# Altium footprint library myPCBLib.PcbLib: 113 footprints (part 7 of 8)
Each footprint in its own frame and in the unit in brackets; x right, y up, seen from the top. Pads: shape width x height; smd on the part's side, far side on the other; paste and mask are expansions set on the pad; w line width, h text height; cw(c..) or ccw(c..) is an arc to the next point about the centre after c.
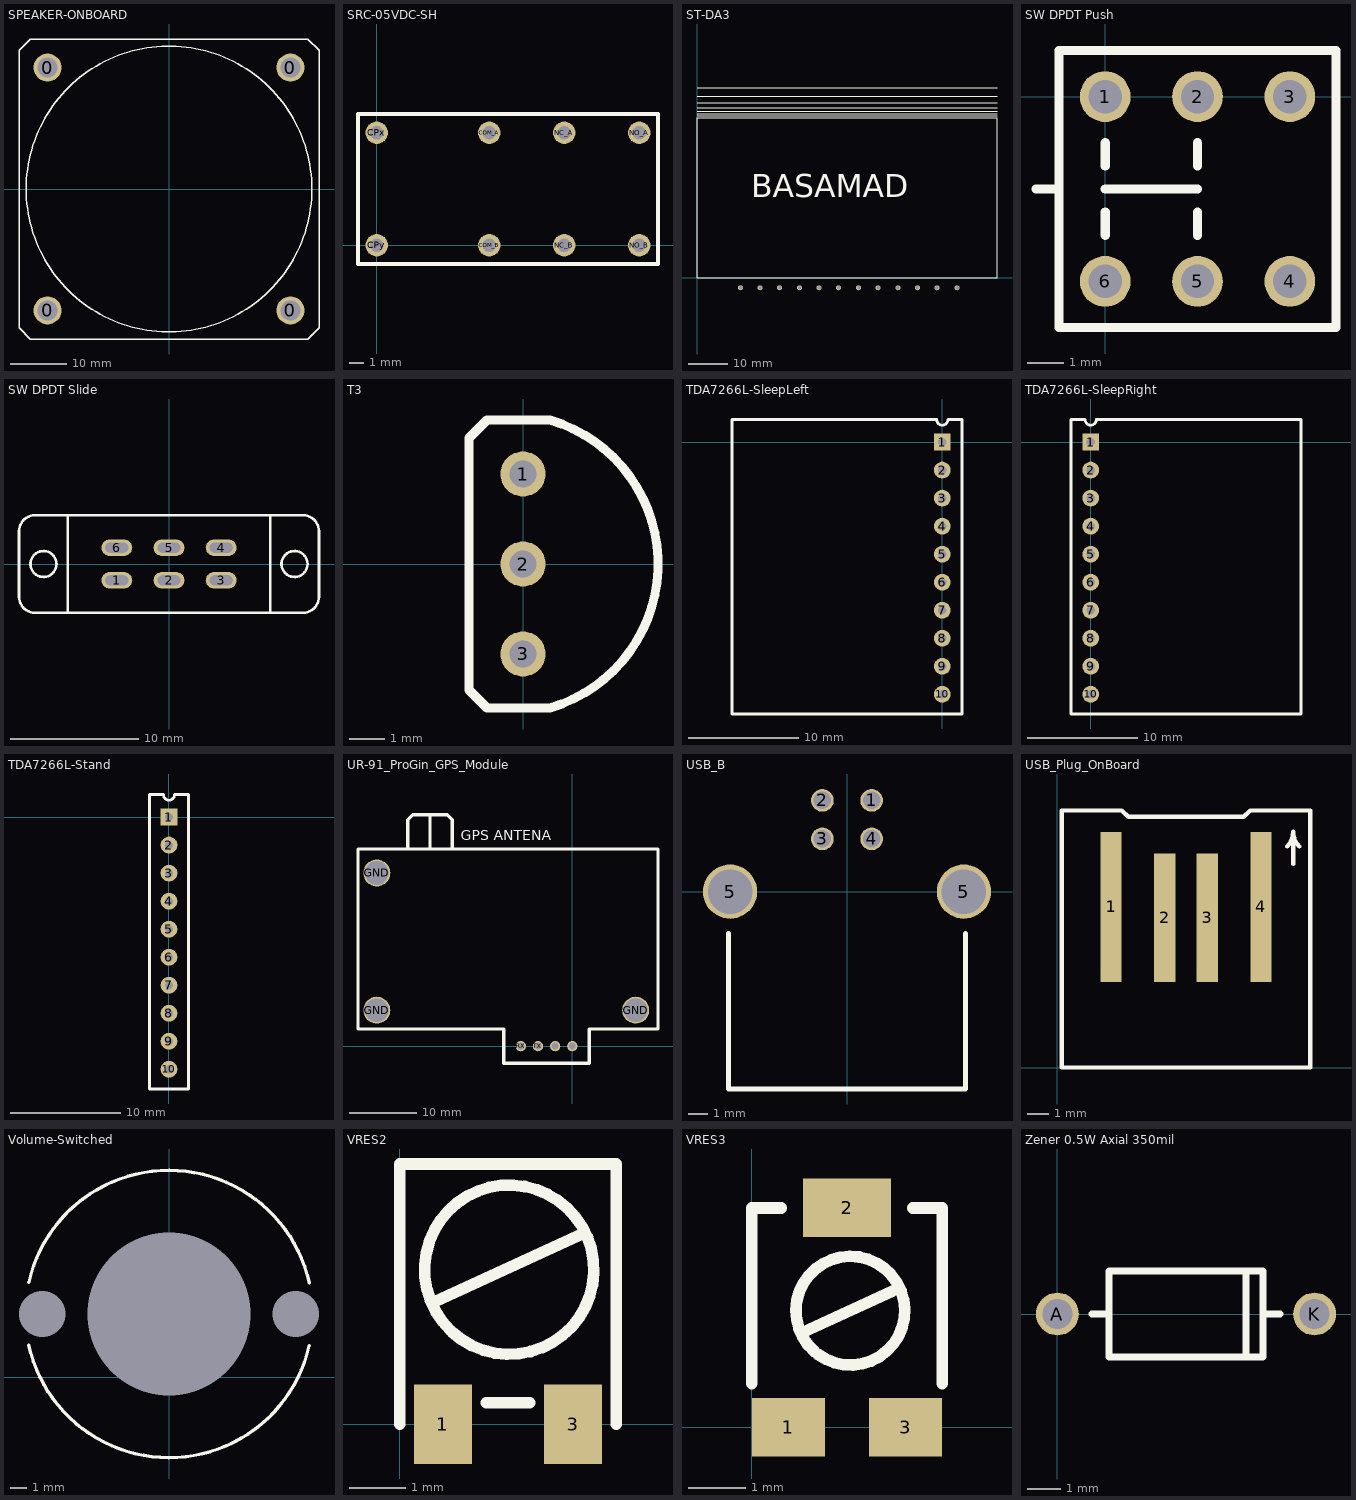
[diagram p6: the footprints below, top view; thin cyan lines are the x and y axes]

## SPEAKER-ONBOARD [mm]
pads (4):
  round 5 hole 3.5: 0(-21.59,-21.59) 0(-21.59,21.59) 0(21.59,-21.59) 0(21.59,21.59)
Top Overlay:
  circle w0.254: c0,0 r25.4
  lines w0.254: -26.67,-24.638 -26.67,24.638 -24.638,26.67 24.638,26.67 26.67,24.638 26.67,-24.638 24.638,-26.67 -24.638,-26.67 -26.67,-24.638

## SRC-05VDC-SH [mil] "Tele-Comunication Relay"
height 450
pads (8):
  round 60 hole 35.43: COM_A(300,300) COM_B(300,0) CPx(0,300) CPy(0,0) NC_A(500,300) NC_B(500,0) NO_A(700,300) NO_B(700,0)
Top Overlay:
  lines w10: -50,-50 -50,350 750,350 750,-50 -50,-50

## ST-DA3 [mil] "ST-DA3 Amplifier"
height 787.4
pads (12):
  round 50 hole 35: 1(435,-100) 2(630,-100) 3(825,-100) 4(1025,-100) 5(1220,-100) 6(1415,-100) 7(1615,-100) 8(1810,-100) 9(2010,-100) 10(2205,-100) 11(2400,-100) 12(2600,-100)
Top Overlay:
  lines w8: 0,1620 3000,1620 ; 0,1640 3000,1640 ; 0,1665 3000,1665 ; 0,1700 3000,1700 ; 0,1750 3000,1750 ; 0,1815 3000,1815 ; 0,1900 3000,1900 ; 0,0 3000,0 3000,1600 0,1600 0,0
  text "BASAMAD" at 540,730 h393.7

## SW DPDT Push [mil]
pads (6):
  round 55 hole 36: 1(0,0) 2(100,0) 3(200,0) 4(200,-200) 5(100,-200) 6(0,-200)
Top Overlay:
  lines w10: -75,-100 -50,-100 ; 0,-150 0,-125 ; 0,-100 100,-100 ; 0,-75 0,-50 ; 100,-150 100,-125 ; 100,-75 100,-50 ; -50,-250 250,-250 250,50 -50,50 -50,-250

## SW DPDT Slide [mil]
pads (6):
  oval 95x50 hole 30 slot 70 at 0 deg: 1(-160,-50) 2(0,-50) 3(160,-50) 4(160,50) 5(0,50) 6(-160,50)
Top Overlay:
  circle w8: c385,0 r40
  circle w8: c-385,0 r40
  lines w8: -310,-150 -410,-150 cw(c-410,-100) -460,-100 -460,100 cw(c-410,100) -410,150 -310,150 ; -310,-150 -310,150 ; -310,-150 310,-150 ; -310,150 310,150 ; 310,-150 410,-150 ccw(c410,-100) 460,-100 460,100 ccw(c410,100) 410,150 310,150 ; 310,-150 310,150

## T3 [mil] "Transistor truogh hole - 100 mil pitch - 3 pin"
pads (3):
  round 50 hole 30: 1(0,100) 2(0,0) 3(0,-100)
Top Overlay:
  lines w10: -60,-140 -60,140 -40,160 30,160 cw(c-16.67,0) 30,-160 -40,-160 -60,-140
  text "." at -100,100 h60

## TDA7266L-SleepLeft [mil]
height 118.11
pads (10):
  rect 60x60 hole 30: 1(0,0)
  round 60 hole 30: 2(0,-100) 3(0,-200) 4(0,-300) 5(0,-400) 6(0,-500) 7(0,-600) 8(0,-700) 9(0,-800) 10(0,-900)
Top Overlay:
  lines w10: -750,-970 70,-970 70,80 20,80 cw(c0,80) -20,80 -750,80 -750,-970

## TDA7266L-SleepRight [mil]
height 118.11
pads (10):
  rect 60x60 hole 30: 1(0,0)
  round 60 hole 30: 2(0,-100) 3(0,-200) 4(0,-300) 5(0,-400) 6(0,-500) 7(0,-600) 8(0,-700) 9(0,-800) 10(0,-900)
Top Overlay:
  lines w10: -70,-970 -70,80 -20,80 ccw(c0,80) 20,80 750,80 750,-970 -70,-970

## TDA7266L-Stand [mil]
height 708.66
pads (10):
  rect 60x60 hole 30: 1(0,0)
  round 60 hole 30: 2(0,-100) 3(0,-200) 4(0,-300) 5(0,-400) 6(0,-500) 7(0,-600) 8(0,-700) 9(0,-800) 10(0,-900)
Top Overlay:
  lines w10: -70,-970 -70,80 -20,80 ccw(c0,80) 20,80 70,80 70,-970 -70,-970

## UR-91_ProGin_GPS_Module [mil] "UR-91 ProGin GPS Module"
height 700
pads (7):
  round 157.48 hole 137.8: GND(-1140,210) GND(-1140,1010) GND(370,210)
  round 60 hole 40: GND(0,0) RX(-300,0) TX(-200,0) VCC(-100,0)
Top Overlay:
  lines w20: -960,1150 -960,1320 -930,1350 -730,1350 -700,1320 -700,1150 ; -830,1150 -830,1350 ; -1250,100 -1250,1150 500,1150 500,100 100,100 100,-100 -400,-100 -400,100 -1250,100
  text "GPS ANTENA" at -650,1200 h60

## USB_B [mil]
height 430
pads (6):
  round 46 hole 36: 1(50,185) 2(-50,185) 3(-50,107) 4(50,107)
  round 110 hole 90: 5(-237,0) 5(237,0)
Top Overlay:
  lines w10: -240,-85 -240,-400 240,-400 240,-85
3D body: height 440, standoff -136.49, extent -291.32,-405.31 291.32,244.29

## USB_Plug_OnBoard [mm]
pads (4):
  rect 1x7 smd: 1(2.5,7.5) 4(9.5,7.5)
  rect 1x6 smd: 2(5,7) 3(7,7)
Top Overlay:
  lines w0.203: 10.717,10.317 ccw(c10.034,11) 11,11 ; 11,9.5 11,11 ; 11.283,10.317 cw(c11.966,11) 11,11 ; 0.2,0 0.2,12 3,12 3.3,11.7 8.7,11.7 9,12 11.8,12 11.8,0 0.2,0

## Volume-Switched [mil]
pads (3):
  round 0 hole 110: 0(-300,150) 0(300,150)
  round 0 hole 385: 0(0,150)
Top Overlay:
  lines w8: -331.82,75.71 ccw(c0,150) 331.58,74.64 ; -331.58,225.36 cw(c0,150) 331.82,224.29

## VRES2 [mil] "Variable Resistor 2 Tap 175x150 mil"
pads (2):
  rect 40x55 smd: 1(30,0) 3(120,0)
Top Overlay:
  lines w8: 0,0 0,180 150,180 150,0 ; 25,85 127.36,132.25 ; 35,65 cw(c75.85,106.92) 36.48,63.61 ; 60,15 90,15

## VRES3 [mil] "Variable Resistor 3 Tap 150x125 mil"
pads (3):
  rect 50x40 smd: 1(25,0) 3(105,0)
  rect 60x40 smd: 2(65,150)
Top Overlay:
  lines w8: 0,30 0,150 20,150 ; 35,65 95.88,93.1 ; 42.82,51.76 cw(c67.26,79.77) 45,50 ; 110,150 130,150 130,30

## Zener 0.5W Axial 350mil [mil]
pads (2):
  round 50 hole 35: A(0,0) K(300,0)
Top Overlay:
  lines w8: 40,0 60,0 ; 220,-50 220,50 ; 240,0 260,0 ; 60,0 60,50 240,50 240,-50 60,-50 60,0